# Altium footprint library DipComponent.PcbLib: 303 footprints (part 13 of 19)
Each footprint in its own frame and in the unit in brackets; x right, y up, seen from the top. Pads: shape width x height; smd on the part's side, far side on the other; paste and mask are expansions set on the pad; w line width, h text height; cw(c..) or ccw(c..) is an arc to the next point about the centre after c.
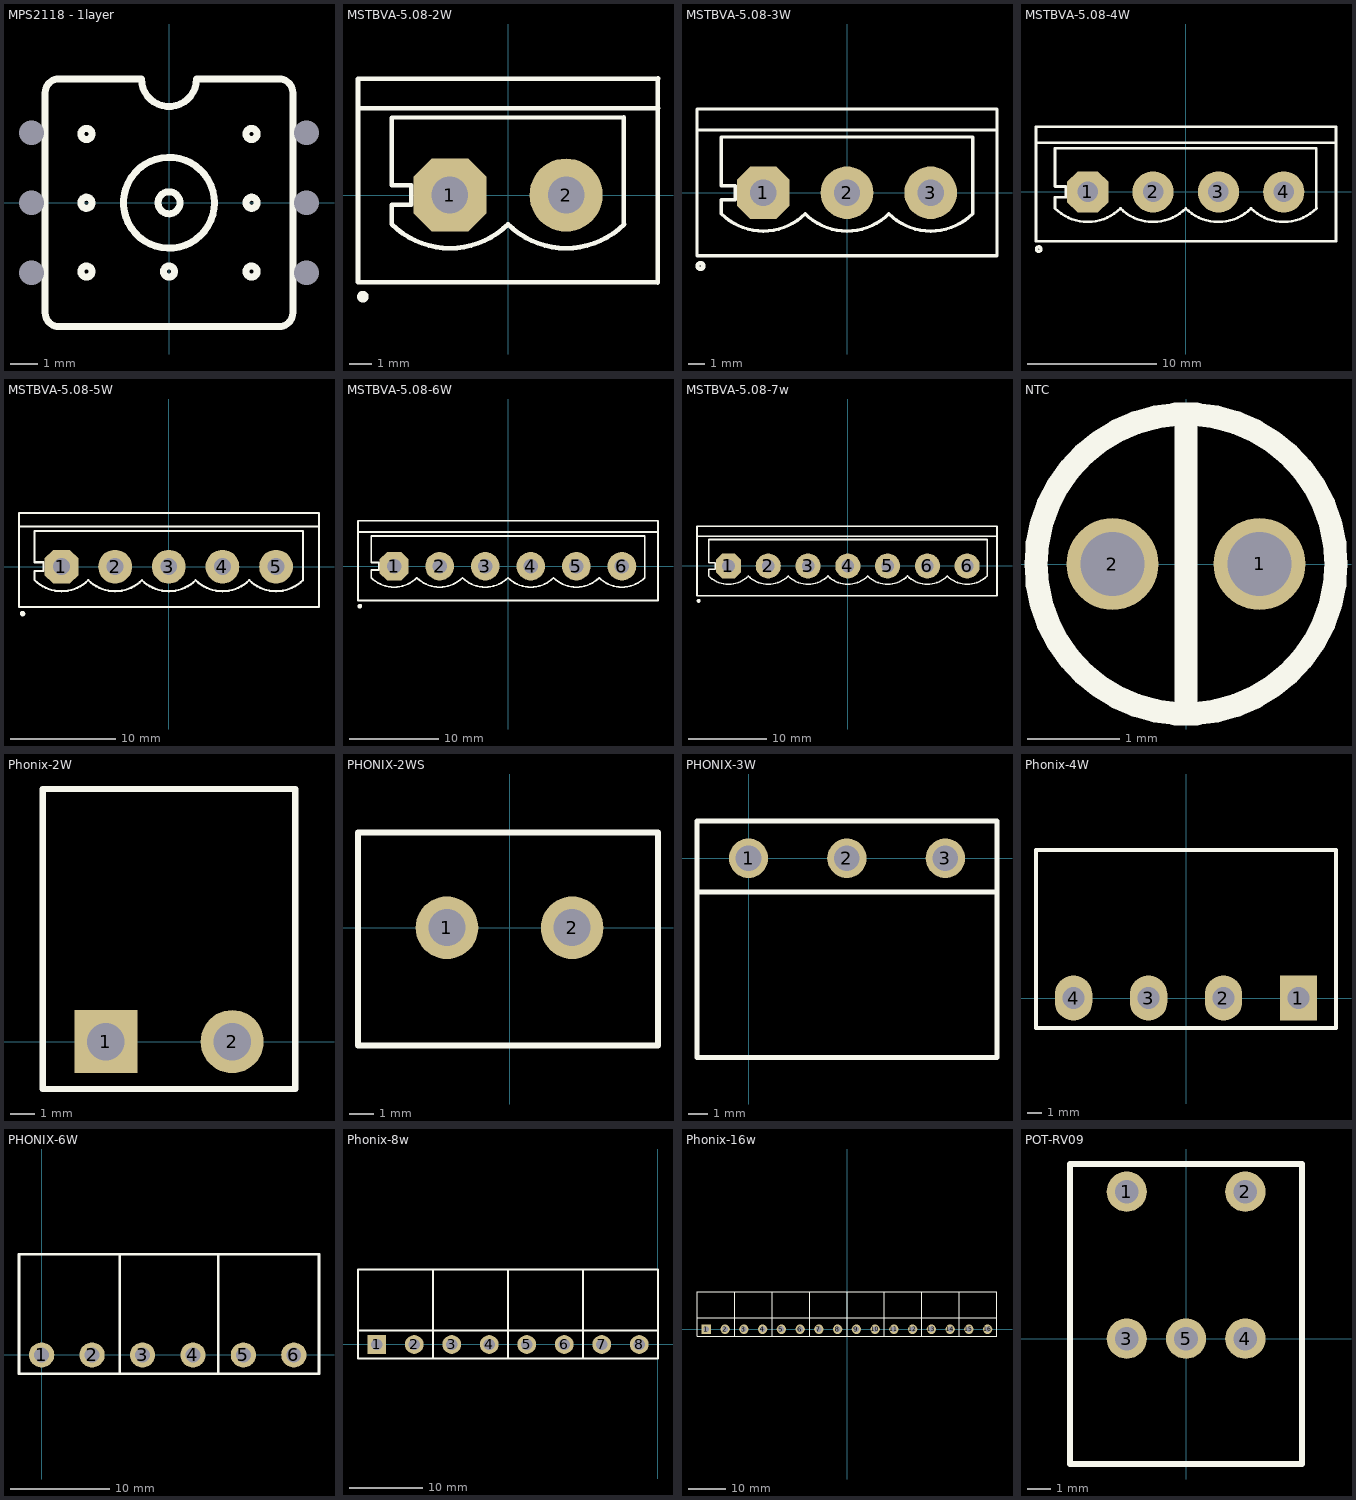
[diagram p12: the footprints below, top view; thin cyan lines are the x and y axes]

## MPS2118 - 1layer [mm] "presser Sensor"
pads (6):
  round 0 / inner oval 2.032x1.524 / far side rect 2.032x1.524 hole 0.9 unplated: 1(-5,2.54)
  round 0 / inner oval 2.032x1.524 / far side oval 2.032x1.524 hole 0.9 unplated: 2(-5,0) 3(-5,-2.54) 4(5,-2.54) 5(5,0) 6(5,2.54)
Top Overlay:
  circle w0.254: c3,2.5 r0.202
  circle w0.254: c-3,2.5 r0.202
  circle w0.254: c-3,-2.5 r0.202
  circle w0.254: c-3,0 r0.202
  circle w0.254: c0,-2.5 r0.202
  circle w0.254: c3,-2.5 r0.202
  circle w0.254: c3,0 r0.202
  circle w0.254: c0,0 r0.4
  circle w0.254: c0,0 r1.65
  lines w0.254: -4.5,-4 ccw(c-4,-4) -4,-4.5 4,-4.5 ccw(c4,-4) 4.5,-4 4.5,4 ccw(c4,4) 4,4.5 1,4.5 cw(c0,4.5) -1,4.5 -4,4.5 ccw(c-4,4) -4.5,4 -4.5,-4
3D body: height 3.13, standoff 0.03, extent -4.5,-4.5 4.5,4.5
3D body: height 9.13, standoff 3.13, extent -1.65,-1.65 1.65,1.65

## MSTBVA-5.08-2W [mm]
pads (2):
  oct 3.2x3.2 hole 1.6: 1(-2.54,0)
  round 3.2 hole 1.6: 2(2.54,0)
Top Overlay:
  circle w0.254: c-6.35,-4.445 r0.127
  lines w0.203: -6.562,3.81 6.56,3.8 ; -5.084,-1.274 ccw(c-2.54,1.27) 0.004,-1.274 ; -5.08,-1.27 -5.08,-0.423 -4.233,-0.423 -4.233,0.423 -5.08,0.423 -5.08,3.387 5.06,3.4 ; -0.004,-1.274 ccw(c2.54,1.27) 5.084,-1.274 ; 5.06,-1.27 5.06,3.387 ; 6.542,5.08 6.542,-3.823 -6.562,-3.81 -6.562,5.08 6.56,5.1
3D body "MSTBVA-2Way.stp": height 12, standoff -3.9, extent -6,-3.81 6,4.79

## MSTBVA-5.08-3W [mm]
pads (3):
  oct 3.2x3.2 hole 1.6: 1(-5.08,0)
  round 3.2 hole 1.6: 2(0,0) 3(5.08,0)
Top Overlay:
  circle w0.254: c-8.89,-4.445 r0.18
  lines w0.203: -9.102,3.81 9.102,3.81 ; -7.624,-1.274 ccw(c-5.08,1.27) -2.536,-1.274 ; -7.62,-1.27 -7.62,-0.423 -6.773,-0.423 -6.773,0.423 -7.62,0.423 -7.62,3.387 7.62,3.387 7.62,-1.27 ; -2.544,-1.274 ccw(c0,1.27) 2.544,-1.274 ; 2.536,-1.274 ccw(c5.08,1.27) 7.624,-1.274 ; -9.102,-3.825 9.102,-3.825 9.102,5.08 -9.102,5.08 -9.102,-3.825
3D body "MSTBVA-3Way.stp": height 12, standoff -3.9, extent -8.5,-3.825 8.5,4.775

## MSTBVA-5.08-4W [mm]
pads (4):
  oct 3.2x3.2 hole 1.6: 1(-7.62,0)
  round 3.2 hole 1.6: 2(-2.54,0) 3(2.54,0) 4(7.62,0)
Top Overlay:
  circle w0.254: c-11.43,-4.445 r0.18
  lines w0.203: -11.642,3.81 11.684,3.81 ; -10.164,-1.274 ccw(c-7.62,1.27) -5.076,-1.274 ; -10.16,-1.27 -10.16,-0.423 -9.313,-0.423 -9.313,0.423 -10.16,0.423 -10.16,3.387 10.16,3.387 10.16,-1.27 ; -5.084,-1.274 ccw(c-2.54,1.27) 0.004,-1.274 ; -0.004,-1.274 ccw(c2.54,1.27) 5.084,-1.274 ; 5.076,-1.274 ccw(c7.62,1.27) 10.164,-1.274 ; -11.642,-3.825 -11.642,5.08 11.684,5.08 11.684,-3.825 -11.642,-3.825
3D body "MSTBVA-4Way.stp": height 12, standoff -3.9, extent -11.16,-3.81 11.16,4.79

## MSTBVA-5.08-5W [mm]
pads (5):
  oct 3.2x3.2 hole 1.6: 1(-10.16,0)
  round 3.2 hole 1.6: 2(-5.08,0) 3(0,0) 4(5.08,0) 5(10.16,0)
Top Overlay:
  circle w0.254: c-13.843,-4.445 r0.127
  lines w0.203: -14.182,3.81 14.224,3.81 ; -12.704,-1.274 ccw(c-10.16,1.27) -7.616,-1.274 ; -12.7,-1.27 -12.7,-0.423 -11.853,-0.423 -11.853,0.423 -12.7,0.423 -12.7,3.387 12.7,3.387 12.7,-1.27 ; -7.624,-1.274 ccw(c-5.08,1.27) -2.536,-1.274 ; -2.544,-1.274 ccw(c0,1.27) 2.544,-1.274 ; 2.536,-1.274 ccw(c5.08,1.27) 7.624,-1.274 ; 7.616,-1.274 ccw(c10.16,1.27) 12.704,-1.274 ; -14.182,-3.81 14.224,-3.81 14.224,5.08 -14.182,5.08 -14.182,-3.81
3D body "MSTBVA-5Way.stp": height 12, standoff -3.9, extent -13.7,-3.774 13.7,4.826

## MSTBVA-5.08-6W [mm]
pads (6):
  oct 3.2x3.2 hole 1.6: 1(-12.7,0)
  round 3.2 hole 1.6: 2(-7.62,0) 3(-2.54,0) 4(2.54,0) 5(7.62,0) 6(12.7,0)
Top Overlay:
  circle w0.254: c-16.51,-4.445 r0.127
  lines w0.203: -16.722,3.81 16.722,3.81 ; -15.244,-1.274 ccw(c-12.7,1.27) -10.156,-1.274 ; -15.24,-1.27 -15.24,-0.423 -14.393,-0.423 -14.393,0.423 -15.24,0.423 -15.24,3.387 15.24,3.387 15.24,-1.27 ; -10.164,-1.274 ccw(c-7.62,1.27) -5.076,-1.274 ; -5.084,-1.274 ccw(c-2.54,1.27) 0.004,-1.274 ; -0.004,-1.274 ccw(c2.54,1.27) 5.084,-1.274 ; 5.076,-1.274 ccw(c7.62,1.27) 10.164,-1.274 ; 10.156,-1.274 ccw(c12.7,1.27) 15.244,-1.274 ; -16.722,-3.81 -16.722,5.08 16.722,5.08 16.722,-3.81 -16.722,-3.81
3D body "MSTBVA-6Way.stp": height 12, standoff -3.9, extent -16.24,-3.799 16.24,4.801

## MSTBVA-5.08-7w [mm]
pads (7):
  oct 3.2x3.2 hole 1.6: 1(-15.24,0)
  round 3.2 hole 1.6: 2(-10.16,0) 3(-5.08,0) 4(0,0) 5(5.08,0) 6(10.16,0) 6(15.24,0)
Top Overlay:
  circle w0.254: c-19.05,-4.445 r0.127
  lines w0.203: -19.262,3.81 19.05,3.81 ; -17.784,-1.274 ccw(c-15.24,1.27) -12.696,-1.274 ; -17.78,-1.27 -17.78,-0.423 -16.933,-0.423 -16.933,0.423 -17.78,0.423 -17.78,3.387 17.78,3.387 17.78,-1.27 ; -12.704,-1.274 ccw(c-10.16,1.27) -7.616,-1.274 ; -7.624,-1.274 ccw(c-5.08,1.27) -2.536,-1.274 ; -2.544,-1.274 ccw(c0,1.27) 2.544,-1.274 ; 2.536,-1.274 ccw(c5.08,1.27) 7.624,-1.274 ; 7.616,-1.274 ccw(c10.16,1.27) 12.704,-1.274 ; 12.696,-1.274 ccw(c15.24,1.27) 17.784,-1.274 ; -19.262,-3.81 19.05,-3.81 19.05,5.08 -19.262,5.08 -19.262,-3.81
3D body "MSTBVA-7Way.stp": height 12, standoff -3.9, extent -18.5,-3.901 18.5,4.699

## NTC [mm]
pads (2):
  round 1 hole 0.7: 1(0.8,0) 2(-0.8,0)
Top Overlay:
  circle w0.254: c0,0 r1.632
  lines w0.254: 0,-1.6 0,0 0,1.6
3D body "NTC1.6mm.step": height 9.1, standoff -2, extent -1,-0.991 1,0.991

## Phonix-2W [mm]
pads (2):
  rect 2.54x2.54 hole 1.5: 1(-38.1,0)
  round 2.54 hole 1.5: 2(-33.02,0)
Top Overlay:
  lines w0.254: -40.64,-1.905 -40.64,10.16 -30.48,10.16 -30.48,-1.905 -40.64,-1.905
3D body "User Library-MSTB 2,5-2-G 1754436.STEP": height 3, standoff -9.1, extent -40.513,-1.961 -30.513,10.039

## PHONIX-2WS [mm] "stright"
pads (2):
  round 2.54 hole 1.5: 1(-2.54,0) 2(2.54,0)
Top Overlay:
  lines w0.254: -6.147,-4.775 -6.147,3.861 6.02,3.861 6.02,-4.775 -6.147,-4.775
3D body "phonix2w.stp": height 12, standoff -3.9, extent -6.089,-4.764 6.071,3.836

## PHONIX-3W [mm]
pads (3):
  round 2 hole 1.3: 1(0,0) 2(5,0) 3(10,0)
Top Overlay:
  lines w0.254: -2.616,-1.727 -2.616,-1.702 12.624,-1.702 ; -2.616,-10.109 12.624,-10.109 12.624,1.905 -2.616,1.905 -2.616,-10.109
3D body "User Library-Phoenix Contact MSTB-2_5_3G.STEP": height 8.7, standoff -3.4, extent -2.62,-10.1 12.62,1.9

## Phonix-4W [mil] "green2 part"
pads (4):
  rect 100x120 hole 59.06: 1(300,0)
  oval 100x120 hole 59.06: 2(100,0) 3(-100,0) 4(-300,0)
Top Overlay:
  lines w10: -400,-80 400,-80 400,395 -400,395 -400,-80
3D body "User Library-MSTB 2,5-4-G-5,08 1759033.STEP": height 338.58, standoff -137.8, extent -400,-77.53 400,395
3D body "User Library-Green 4w Socket 5_08mm.step": height 633.85, standoff 19.67, extent -398.43,60.59 398.43,785

## PHONIX-6W [mm]
pads (6):
  round 2.54 hole 1.5: 1(0,0) 2(5.08,0) 3(10.16,0) 4(15.24,0) 5(20.32,0) 6(25.4,0)
Top Overlay:
  lines w0.254: 7.874,-1.905 7.874,10.16 ; 17.78,-1.905 17.78,10.16 ; -2.286,-1.905 -2.286,10.16 27.94,10.16 27.94,-1.905 -2.159,-1.905 -2.286,-1.905
3D body "User Library-MSTB 2,5-2-G 1754436.STEP": height 3, standoff -9.1, extent 17.831,-1.936 27.831,10.064
3D body "User Library-MSTB 2,5-2-G 1754436.STEP": height 3, standoff -9.1, extent 7.823,-1.936 17.823,10.064
3D body "User Library-MSTB 2,5-2-G 1754436.STEP": height 3, standoff -9.1, extent -2.177,-1.936 7.823,10.064

## Phonix-8w [mm]
pads (8):
  rect 2.54x2.54 hole 1.5: 1(-38.1,0)
  round 2.54 hole 1.5: 2(-33.02,0) 3(-27.94,0) 4(-22.86,0) 5(-17.78,0) 6(-12.7,0) 7(-7.62,0) 8(-2.54,0)
Top Overlay:
  lines w0.254: -40.64,1.905 0,1.905 ; -30.48,-1.905 -30.48,10.16 ; -20.32,-1.905 -20.32,10.16 ; -10.16,-1.905 -10.16,10.16 ; -40.64,-1.905 -40.64,10.16 0,10.16 0,-1.905 -40.64,-1.905
3D body "User Library-MSTB 2,5-2-G 1754436.STEP": height 3, standoff -9.1, extent -20.211,-1.936 -10.211,10.064
3D body "User Library-MSTB 2,5-2-G 1754436.STEP": height 3, standoff -9.1, extent -30.353,-1.961 -20.353,10.039
3D body "User Library-MSTB 2,5-2-G 1754436.STEP": height 3, standoff -9.1, extent -40.513,-1.961 -30.513,10.039
3D body "User Library-MSTB 2,5-2-G 1754436.STEP": height 3, standoff -9.1, extent -10.051,-1.961 -0.051,10.039

## Phonix-16w [mm]
pads (16):
  rect 2.54x2.54 hole 1.5: 1(-38.1,0)
  round 2.54 hole 1.5: 2(-33.02,0) 3(-27.94,0) 4(-22.86,0) 5(-17.78,0) 6(-12.7,0) 7(-7.62,0) 8(-2.54,0) 9(2.54,0) 10(7.62,0) 11(12.7,0) 12(17.78,0) 13(22.86,0) 14(27.94,0) 15(33.02,0) 16(38.1,0)
Top Overlay:
  lines w0.254: -40.64,3.175 40.64,3.175 ; -30.48,-1.905 -30.48,10.16 ; -20.32,-1.905 -20.32,10.16 ; -10.16,-1.905 -10.16,10.16 ; 0,-1.905 0,10.16 ; 10.16,-1.905 10.16,10.16 ; 20.32,-1.905 20.32,10.16 ; 30.48,-1.905 30.48,10.16 ; -40.64,-1.905 -40.64,10.16 40.64,10.16 40.64,-1.905 -40.64,-1.905
3D body "User Library-MSTB 2,5-2-G 1754436.STEP": height 3, standoff -9.1, extent 20.429,-1.936 30.429,10.064
3D body "User Library-MSTB 2,5-2-G 1754436.STEP": height 3, standoff -9.1, extent 30.607,-1.936 40.607,10.064
3D body "User Library-MSTB 2,5-2-G 1754436.STEP": height 3, standoff -9.1, extent -10.051,-1.961 -0.051,10.039
3D body "User Library-MSTB 2,5-2-G 1754436.STEP": height 3, standoff -9.1, extent 0.055,-1.956 10.055,10.044
3D body "User Library-MSTB 2,5-2-G 1754436.STEP": height 3, standoff -9.1, extent 10.218,-1.936 20.218,10.064
3D body "User Library-MSTB 2,5-2-G 1754436.STEP": height 3, standoff -9.1, extent -40.513,-1.961 -30.513,10.039
3D body "User Library-MSTB 2,5-2-G 1754436.STEP": height 3, standoff -9.1, extent -30.353,-1.961 -20.353,10.039
3D body "User Library-MSTB 2,5-2-G 1754436.STEP": height 3, standoff -9.1, extent -20.211,-1.936 -10.211,10.064

## POT-RV09 [mm]
pads (5):
  round 1.7 hole 1: 1(-2.5,6.2) 2(2.5,6.2) 3(-2.5,0) 4(2.5,0) 5(0,0)
Top Overlay:
  lines w0.254: -4.891,-5.283 4.888,-5.283 4.888,7.366 -4.891,7.366 -4.891,-5.283
3D body "Potentiometerquad-09-1.STEP": height 11.35, standoff -3.5, extent -4.742,-19.934 4.763,7.366